# Altium schematic symbol library jlcpcb_2025_04_ferrites_extended_0603.schlib: 833 symbols (part 4 of 4)
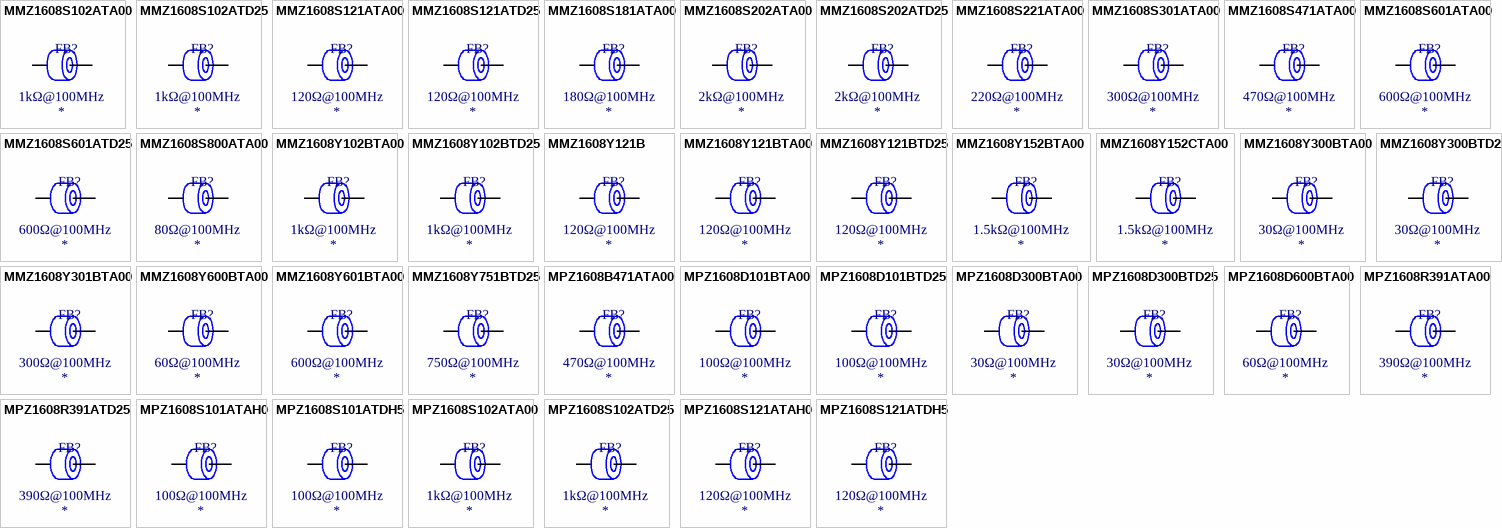
[diagram p23: symbols MMZ1608S102ATA00 to MPZ1608S121ATDH5]

## MPZ1608D101BTA00
designator FB?  Impedance @ Frequency: 100Ω@100MHz
Ferrite, 100Ω@100MHz, ±25%, 150mΩ, 1A, SMD 0603; Manufacturer: TDK; Manufacturer Part Number: MPZ1608D101BTA00; Package Size: 0603; JLCPCB Basic Part: No; JLCPCB Part Number: C87554; Supplier 1: LCSC; Category: Ferrite Beads; Supplier Part Number 1: C87554; Tolerance: ±25%; Rated Current: 1A; DC Resistance: 150mΩ; RoHS: Yes; ComponentLink1Description: Datasheet; ComponentLink1URL: https://wmsc.lcsc.com/wmsc/upload/file/pdf/v2/lcsc/2304140030_TDK-MPZ1608D101BTA00_C87554.pdf; ComponentLink2Description: JLCPCB Part URL; ComponentLink2URL: https://jlcpcb.com/partdetail/C87554; ComponentLink3Description: LCSC Part URL; ComponentLink3URL: https://lcsc.com/product-detail/Ferrite-Beads_TDK-TDK-MPZ1608D101BTA00_C87554.html
footprint FB-0603 (0603 (1608M) Ferrite)
pins: 1, 2

## MPZ1608D101BTD25
designator FB?  Impedance @ Frequency: 100Ω@100MHz
Ferrite, 100Ω@100MHz, ±25%, 150mΩ, 1A, SMD 0603; Manufacturer: TDK; Manufacturer Part Number: MPZ1608D101BTD25; Package Size: 0603; JLCPCB Basic Part: No; JLCPCB Part Number: C404684; Supplier 1: LCSC; Category: Ferrite Beads; Supplier Part Number 1: C404684; Tolerance: ±25%; Rated Current: 1A; DC Resistance: 150mΩ; RoHS: Yes; ComponentLink1Description: Datasheet; ComponentLink1URL: https://wmsc.lcsc.com/wmsc/upload/file/pdf/v2/lcsc/1912111437_TDK-MPZ1608D101BTD25_C404684.pdf; ComponentLink2Description: JLCPCB Part URL; ComponentLink2URL: https://jlcpcb.com/partdetail/C404684; ComponentLink3Description: LCSC Part URL; ComponentLink3URL: https://lcsc.com/product-detail/Ferrite-Beads_TDK-TDK-MPZ1608D101BTD25_C404684.html
footprint FB-0603 (0603 (1608M) Ferrite)
pins: 1, 2

## MPZ1608D300BTA00
designator FB?  Impedance @ Frequency: 30Ω@100MHz
Ferrite, 30Ω@100MHz, 60mΩ, 1.8A, SMD 0603; Manufacturer: TDK; Manufacturer Part Number: MPZ1608D300BTA00; Package Size: 0603; JLCPCB Basic Part: No; JLCPCB Part Number: C501997; Supplier 1: LCSC; Category: Ferrite Beads; Supplier Part Number 1: C501997; Rated Current: 1.8A; DC Resistance: 60mΩ; RoHS: Yes; ComponentLink1Description: Datasheet; ComponentLink1URL: https://wmsc.lcsc.com/wmsc/upload/file/pdf/v2/lcsc/2005151007_TDK-MPZ1608D300BTA00_C501997.pdf; ComponentLink2Description: JLCPCB Part URL; ComponentLink2URL: https://jlcpcb.com/partdetail/C501997; ComponentLink3Description: LCSC Part URL; ComponentLink3URL: https://lcsc.com/product-detail/Ferrite-Beads_TDK-TDK-MPZ1608D300BTA00_C501997.html
pins: 1, 2

## MPZ1608D300BTD25
designator FB?  Impedance @ Frequency: 30Ω@100MHz
Ferrite, 30Ω@100MHz, 60mΩ, 1.8A, SMD 0603; Manufacturer: TDK; Manufacturer Part Number: MPZ1608D300BTD25; Package Size: 0603; JLCPCB Basic Part: No; JLCPCB Part Number: C307767; Supplier 1: LCSC; Category: Ferrite Beads; Supplier Part Number 1: C307767; Rated Current: 1.8A; DC Resistance: 60mΩ; RoHS: Yes; ComponentLink1Description: Datasheet; ComponentLink1URL: https://wmsc.lcsc.com/wmsc/upload/file/pdf/v2/lcsc/2401161221_TDK-MPZ1608D300BTD25_C307767.pdf; ComponentLink2Description: JLCPCB Part URL; ComponentLink2URL: https://jlcpcb.com/partdetail/C307767; ComponentLink3Description: LCSC Part URL; ComponentLink3URL: https://lcsc.com/product-detail/Ferrite-Beads_TDK-TDK-MPZ1608D300BTD25_C307767.html
pins: 1, 2

## MPZ1608D600BTA00
designator FB?  Impedance @ Frequency: 60Ω@100MHz
Ferrite, 60Ω@100MHz, ±25%, 100mΩ, 1.2A, SMD 0603; Manufacturer: TDK; Manufacturer Part Number: MPZ1608D600BTA00; Package Size: 0603; JLCPCB Basic Part: No; JLCPCB Part Number: C275482; Supplier 1: LCSC; Category: Ferrite Beads; Supplier Part Number 1: C275482; Tolerance: ±25%; Rated Current: 1.2A; DC Resistance: 100mΩ; RoHS: Yes; ComponentLink1Description: Datasheet; ComponentLink1URL: https://wmsc.lcsc.com/wmsc/upload/file/pdf/v2/lcsc/2304140030_TDK-MPZ1608D600BTA00_C275482.pdf; ComponentLink2Description: JLCPCB Part URL; ComponentLink2URL: https://jlcpcb.com/partdetail/C275482; ComponentLink3Description: LCSC Part URL; ComponentLink3URL: https://lcsc.com/product-detail/Ferrite-Beads_TDK-TDK-MPZ1608D600BTA00_C275482.html
footprint FB-0603 (0603 (1608M) Ferrite)
pins: 1, 2

## MPZ1608R391ATA00
designator FB?  Impedance @ Frequency: 390Ω@100MHz
Ferrite, 390Ω@100MHz, ±25%, 120mΩ, 1.2A, SMD 0603; Manufacturer: TDK; Manufacturer Part Number: MPZ1608R391ATA00; Package Size: 0603; JLCPCB Basic Part: No; JLCPCB Part Number: C275483; Supplier 1: LCSC; Category: Ferrite Beads; Supplier Part Number 1: C275483; Tolerance: ±25%; Rated Current: 1.2A; DC Resistance: 120mΩ; RoHS: Yes; ComponentLink1Description: Datasheet; ComponentLink1URL: https://wmsc.lcsc.com/wmsc/upload/file/pdf/v2/lcsc/2304140030_TDK-MPZ1608R391ATA00_C275483.pdf; ComponentLink2Description: JLCPCB Part URL; ComponentLink2URL: https://jlcpcb.com/partdetail/C275483; ComponentLink3Description: LCSC Part URL; ComponentLink3URL: https://lcsc.com/product-detail/Ferrite-Beads_TDK-TDK-MPZ1608R391ATA00_C275483.html
footprint FB-0603 (0603 (1608M) Ferrite)
pins: 1, 2

## MPZ1608R391ATD25
designator FB?  Impedance @ Frequency: 390Ω@100MHz
Ferrite, 390Ω@100MHz, 120mΩ, 1.2A, SMD 0603; Manufacturer: TDK; Manufacturer Part Number: MPZ1608R391ATD25; Package Size: 0603; JLCPCB Basic Part: No; JLCPCB Part Number: C307768; Supplier 1: LCSC; Category: Ferrite Beads; Supplier Part Number 1: C307768; Rated Current: 1.2A; DC Resistance: 120mΩ; RoHS: Yes; ComponentLink1Description: Datasheet; ComponentLink1URL: https://wmsc.lcsc.com/wmsc/upload/file/pdf/v2/lcsc/2401161221_TDK-MPZ1608R391ATD25_C307768.pdf; ComponentLink2Description: JLCPCB Part URL; ComponentLink2URL: https://jlcpcb.com/partdetail/C307768; ComponentLink3Description: LCSC Part URL; ComponentLink3URL: https://lcsc.com/product-detail/Ferrite-Beads_TDK-TDK-MPZ1608R391ATD25_C307768.html
pins: 1, 2

## MPZ1608S101ATAH0
designator FB?  Impedance @ Frequency: 100Ω@100MHz
Ferrite, 100Ω@100MHz, ±25%, 30mΩ, 3A, SMD 0603; Manufacturer: TDK; Manufacturer Part Number: MPZ1608S101ATAH0; Package Size: 0603; JLCPCB Basic Part: No; JLCPCB Part Number: C107332; Supplier 1: LCSC; Category: Ferrite Beads; Supplier Part Number 1: C107332; Tolerance: ±25%; Rated Current: 3A; DC Resistance: 30mΩ; RoHS: Yes; ComponentLink1Description: Datasheet; ComponentLink1URL: https://wmsc.lcsc.com/wmsc/upload/file/pdf/v2/lcsc/2304140030_TDK-MPZ1608S101ATAH0_C107332.pdf; ComponentLink2Description: JLCPCB Part URL; ComponentLink2URL: https://jlcpcb.com/partdetail/C107332; ComponentLink3Description: LCSC Part URL; ComponentLink3URL: https://lcsc.com/product-detail/Ferrite-Beads_TDK-TDK-MPZ1608S101ATAH0_C107332.html
footprint FB-0603 (0603 (1608M) Ferrite)
pins: 1, 2

## MPZ1608S101ATDH5
designator FB?  Impedance @ Frequency: 100Ω@100MHz
Ferrite, 100Ω@100MHz, 30mΩ, 3A, SMD 0603; Manufacturer: TDK; Manufacturer Part Number: MPZ1608S101ATDH5; Package Size: 0603; JLCPCB Basic Part: No; JLCPCB Part Number: C307769; Supplier 1: LCSC; Category: Ferrite Beads; Supplier Part Number 1: C307769; Rated Current: 3A; DC Resistance: 30mΩ; RoHS: Yes; ComponentLink1Description: Datasheet; ComponentLink1URL: https://wmsc.lcsc.com/wmsc/upload/file/pdf/v2/lcsc/2401161221_TDK-MPZ1608S101ATDH5_C307769.pdf; ComponentLink2Description: JLCPCB Part URL; ComponentLink2URL: https://jlcpcb.com/partdetail/C307769; ComponentLink3Description: LCSC Part URL; ComponentLink3URL: https://lcsc.com/product-detail/Ferrite-Beads_TDK-TDK-MPZ1608S101ATDH5_C307769.html
pins: 1, 2

## MPZ1608S102ATA00
designator FB?  Impedance @ Frequency: 1kΩ@100MHz
Ferrite, 1kΩ@100MHz, ±25%, 300mΩ, 800mA, SMD 0603; Manufacturer: TDK; Manufacturer Part Number: MPZ1608S102ATA00; Package Size: 0603; JLCPCB Basic Part: No; JLCPCB Part Number: C76814; Supplier 1: LCSC; Category: Ferrite Beads; Supplier Part Number 1: C76814; Tolerance: ±25%; Rated Current: 800mA; DC Resistance: 300mΩ; RoHS: Yes; ComponentLink1Description: Datasheet; ComponentLink1URL: https://wmsc.lcsc.com/wmsc/upload/file/pdf/v2/lcsc/2304140030_TDK-MPZ1608S102ATA00_C76814.pdf; ComponentLink2Description: JLCPCB Part URL; ComponentLink2URL: https://jlcpcb.com/partdetail/C76814; ComponentLink3Description: LCSC Part URL; ComponentLink3URL: https://lcsc.com/product-detail/Ferrite-Beads_TDK-TDK-MPZ1608S102ATA00_C76814.html
footprint FB-0603 (0603 (1608M) Ferrite)
pins: 1, 2

## MPZ1608S102ATD25
designator FB?  Impedance @ Frequency: 1kΩ@100MHz
Ferrite, 1kΩ@100MHz, ±25%, 300mΩ, 800mA, SMD 0603; Manufacturer: TDK; Manufacturer Part Number: MPZ1608S102ATD25; Package Size: 0603; JLCPCB Basic Part: No; JLCPCB Part Number: C193411; Supplier 1: LCSC; Category: Ferrite Beads; Supplier Part Number 1: C193411; Tolerance: ±25%; Rated Current: 800mA; DC Resistance: 300mΩ; RoHS: Yes; ComponentLink1Description: Datasheet; ComponentLink1URL: https://wmsc.lcsc.com/wmsc/upload/file/pdf/v2/lcsc/2304140030_TDK-MPZ1608S102ATD25_C193411.pdf; ComponentLink2Description: JLCPCB Part URL; ComponentLink2URL: https://jlcpcb.com/partdetail/C193411; ComponentLink3Description: LCSC Part URL; ComponentLink3URL: https://lcsc.com/product-detail/Ferrite-Beads_TDK-TDK-MPZ1608S102ATD25_C193411.html
footprint FB-0603 (0603 (1608M) Ferrite)
pins: 1, 2

## MPZ1608S121ATAH0
designator FB?  Impedance @ Frequency: 120Ω@100MHz
Ferrite, 120Ω@100MHz, ±25%, 45mΩ, 2A, SMD 0603; Manufacturer: TDK; Manufacturer Part Number: MPZ1608S121ATAH0; Package Size: 0603; JLCPCB Basic Part: No; JLCPCB Part Number: C114770; Supplier 1: LCSC; Category: Ferrite Beads; Supplier Part Number 1: C114770; Tolerance: ±25%; Rated Current: 2A; DC Resistance: 45mΩ; RoHS: Yes; ComponentLink1Description: Datasheet; ComponentLink1URL: https://wmsc.lcsc.com/wmsc/upload/file/pdf/v2/lcsc/2304140030_TDK-MPZ1608S121ATAH0_C114770.pdf; ComponentLink2Description: JLCPCB Part URL; ComponentLink2URL: https://jlcpcb.com/partdetail/C114770; ComponentLink3Description: LCSC Part URL; ComponentLink3URL: https://lcsc.com/product-detail/Ferrite-Beads_TDK-TDK-MPZ1608S121ATAH0_C114770.html
footprint FB-0603 (0603 (1608M) Ferrite)
pins: 1, 2

## MPZ1608S121ATDH5
designator FB?  Impedance @ Frequency: 120Ω@100MHz
Ferrite, 120Ω@100MHz, 45mΩ, 2A, SMD 0603; Manufacturer: TDK; Manufacturer Part Number: MPZ1608S121ATDH5; Package Size: 0603; JLCPCB Basic Part: No; JLCPCB Part Number: C307770; Supplier 1: LCSC; Category: Ferrite Beads; Supplier Part Number 1: C307770; Rated Current: 2A; DC Resistance: 45mΩ; RoHS: Yes; ComponentLink1Description: Datasheet; ComponentLink1URL: https://wmsc.lcsc.com/wmsc/upload/file/pdf/v2/lcsc/2401161221_TDK-MPZ1608S121ATDH5_C307770.pdf; ComponentLink2Description: JLCPCB Part URL; ComponentLink2URL: https://jlcpcb.com/partdetail/C307770; ComponentLink3Description: LCSC Part URL; ComponentLink3URL: https://lcsc.com/product-detail/Ferrite-Beads_TDK-TDK-MPZ1608S121ATDH5_C307770.html
pins: 1, 2

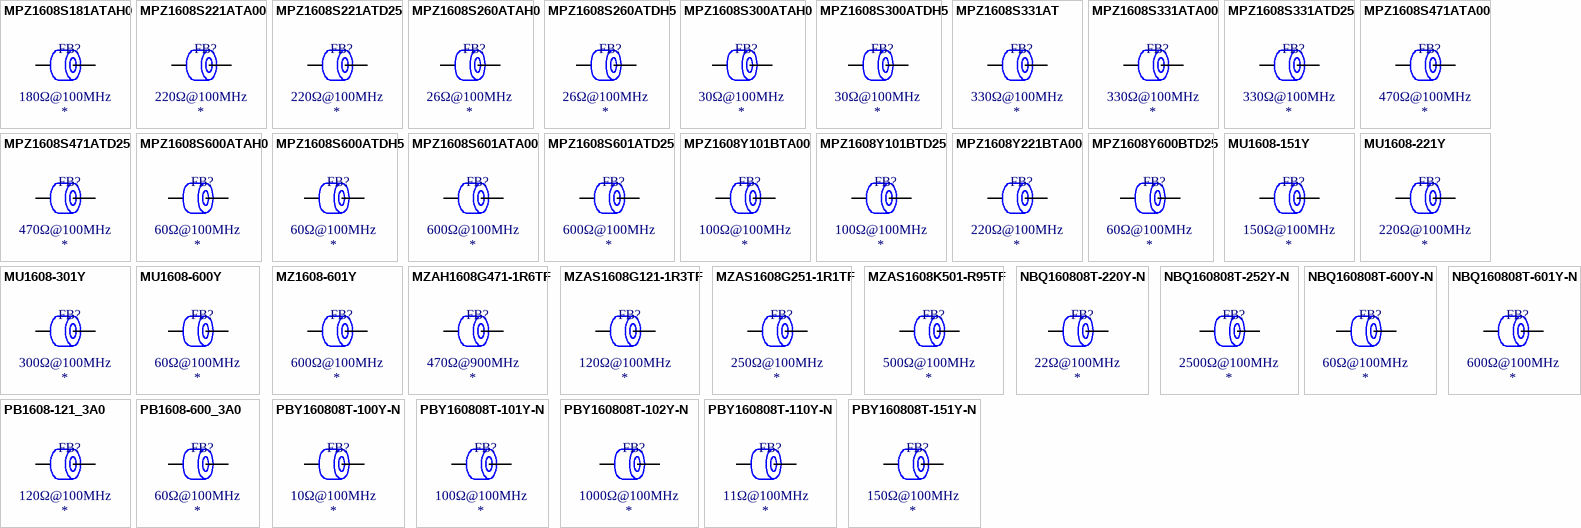
[diagram p16: symbols MPZ1608S181ATAH0 to PBY160808T-151Y-N]

## MPZ1608S181ATAH0
designator FB?  Impedance @ Frequency: 180Ω@100MHz
Ferrite, 180Ω@100MHz, ±25%, 50mΩ, 2A, SMD 0603; Manufacturer: TDK; Manufacturer Part Number: MPZ1608S181ATAH0; Package Size: 0603; JLCPCB Basic Part: No; JLCPCB Part Number: C275484; Supplier 1: LCSC; Category: Ferrite Beads; Supplier Part Number 1: C275484; Tolerance: ±25%; Rated Current: 2A; DC Resistance: 50mΩ; RoHS: Yes; ComponentLink1Description: Datasheet; ComponentLink1URL: https://wmsc.lcsc.com/wmsc/upload/file/pdf/v2/lcsc/2304140030_TDK-MPZ1608S181ATAH0_C275484.pdf; ComponentLink2Description: JLCPCB Part URL; ComponentLink2URL: https://jlcpcb.com/partdetail/C275484; ComponentLink3Description: LCSC Part URL; ComponentLink3URL: https://lcsc.com/product-detail/Ferrite-Beads_TDK-TDK-MPZ1608S181ATAH0_C275484.html
footprint FB-0603 (0603 (1608M) Ferrite)
pins: 1, 2

## MPZ1608S221ATA00
designator FB?  Impedance @ Frequency: 220Ω@100MHz
Ferrite, 220Ω@100MHz, ±25%, 50mΩ, 2.2A, SMD 0603; Manufacturer: TDK; Manufacturer Part Number: MPZ1608S221ATA00; Package Size: 0603; JLCPCB Basic Part: No; JLCPCB Part Number: C76815; Supplier 1: LCSC; Category: Ferrite Beads; Supplier Part Number 1: C76815; Tolerance: ±25%; Rated Current: 2.2A; DC Resistance: 50mΩ; RoHS: Yes; ComponentLink1Description: Datasheet; ComponentLink1URL: https://wmsc.lcsc.com/wmsc/upload/file/pdf/v2/lcsc/1811131630_TDK-MPZ1608S221ATA00_C76815.pdf; ComponentLink2Description: JLCPCB Part URL; ComponentLink2URL: https://jlcpcb.com/partdetail/C76815; ComponentLink3Description: LCSC Part URL; ComponentLink3URL: https://lcsc.com/product-detail/Ferrite-Beads_TDK-TDK-MPZ1608S221ATA00_C76815.html
footprint FB-0603 (0603 (1608M) Ferrite)
pins: 1, 2

## MPZ1608S221ATD25
designator FB?  Impedance @ Frequency: 220Ω@100MHz
Ferrite, 220Ω@100MHz, 50mΩ, 2.2A, SMD 0603; Manufacturer: TDK; Manufacturer Part Number: MPZ1608S221ATD25; Package Size: 0603; JLCPCB Basic Part: No; JLCPCB Part Number: C307771; Supplier 1: LCSC; Category: Ferrite Beads; Supplier Part Number 1: C307771; Rated Current: 2.2A; DC Resistance: 50mΩ; RoHS: Yes; ComponentLink1Description: Datasheet; ComponentLink1URL: https://wmsc.lcsc.com/wmsc/upload/file/pdf/v2/lcsc/2111251830_TDK-MPZ1608S221ATD25_C307771.pdf; ComponentLink2Description: JLCPCB Part URL; ComponentLink2URL: https://jlcpcb.com/partdetail/C307771; ComponentLink3Description: LCSC Part URL; ComponentLink3URL: https://lcsc.com/product-detail/Ferrite-Beads_TDK-TDK-MPZ1608S221ATD25_C307771.html
pins: 1, 2

## MPZ1608S260ATAH0
designator FB?  Impedance @ Frequency: 26Ω@100MHz
Ferrite, 26Ω@100MHz, ±25%, 7mΩ, 6A, SMD 0603; Manufacturer: TDK; Manufacturer Part Number: MPZ1608S260ATAH0; Package Size: 0603; JLCPCB Basic Part: No; JLCPCB Part Number: C275485; Supplier 1: LCSC; Category: Ferrite Beads; Supplier Part Number 1: C275485; Tolerance: ±25%; Rated Current: 6A; DC Resistance: 7mΩ; RoHS: Yes; ComponentLink1Description: Datasheet; ComponentLink1URL: https://wmsc.lcsc.com/wmsc/upload/file/pdf/v2/lcsc/2304140030_TDK-MPZ1608S260ATAH0_C275485.pdf; ComponentLink2Description: JLCPCB Part URL; ComponentLink2URL: https://jlcpcb.com/partdetail/C275485; ComponentLink3Description: LCSC Part URL; ComponentLink3URL: https://lcsc.com/product-detail/Ferrite-Beads_TDK-TDK-MPZ1608S260ATAH0_C275485.html
footprint FB-0603 (0603 (1608M) Ferrite)
pins: 1, 2

## MPZ1608S260ATDH5
designator FB?  Impedance @ Frequency: 26Ω@100MHz
Ferrite, 26Ω@100MHz, ±25%, 7mΩ, 6A, SMD 0603; Manufacturer: TDK; Manufacturer Part Number: MPZ1608S260ATDH5; Package Size: 0603; JLCPCB Basic Part: No; JLCPCB Part Number: C404673; Supplier 1: LCSC; Category: Ferrite Beads; Supplier Part Number 1: C404673; Tolerance: ±25%; Rated Current: 6A; DC Resistance: 7mΩ; RoHS: Yes; ComponentLink1Description: Datasheet; ComponentLink1URL: https://wmsc.lcsc.com/wmsc/upload/file/pdf/v2/lcsc/2304140030_TDK-MPZ1608S260ATDH5_C404673.pdf; ComponentLink2Description: JLCPCB Part URL; ComponentLink2URL: https://jlcpcb.com/partdetail/C404673; ComponentLink3Description: LCSC Part URL; ComponentLink3URL: https://lcsc.com/product-detail/Ferrite-Beads_TDK-TDK-MPZ1608S260ATDH5_C404673.html
footprint FB-0603 (0603 (1608M) Ferrite)
pins: 1, 2

## MPZ1608S300ATAH0
designator FB?  Impedance @ Frequency: 30Ω@100MHz
Ferrite, 30Ω@100MHz, 10mΩ, 5A, SMD 0603; Manufacturer: TDK; Manufacturer Part Number: MPZ1608S300ATAH0; Package Size: 0603; JLCPCB Basic Part: No; JLCPCB Part Number: C275486; Supplier 1: LCSC; Category: Ferrite Beads; Supplier Part Number 1: C275486; Rated Current: 5A; DC Resistance: 10mΩ; RoHS: Yes; ComponentLink1Description: Datasheet; ComponentLink1URL: https://wmsc.lcsc.com/wmsc/upload/file/pdf/v2/lcsc/2304140030_TDK-MPZ1608S300ATAH0_C275486.pdf; ComponentLink2Description: JLCPCB Part URL; ComponentLink2URL: https://jlcpcb.com/partdetail/C275486; ComponentLink3Description: LCSC Part URL; ComponentLink3URL: https://lcsc.com/product-detail/Ferrite-Beads_TDK-TDK-MPZ1608S300ATAH0_C275486.html
pins: 1, 2

## MPZ1608S300ATDH5
designator FB?  Impedance @ Frequency: 30Ω@100MHz
Ferrite, 30Ω@100MHz, 10mΩ, 5A, SMD 0603; Manufacturer: TDK; Manufacturer Part Number: MPZ1608S300ATDH5; Package Size: 0603; JLCPCB Basic Part: No; JLCPCB Part Number: C307772; Supplier 1: LCSC; Category: Ferrite Beads; Supplier Part Number 1: C307772; Rated Current: 5A; DC Resistance: 10mΩ; RoHS: Yes; ComponentLink1Description: Datasheet; ComponentLink1URL: https://wmsc.lcsc.com/wmsc/upload/file/pdf/v2/lcsc/2401161221_TDK-MPZ1608S300ATDH5_C307772.pdf; ComponentLink2Description: JLCPCB Part URL; ComponentLink2URL: https://jlcpcb.com/partdetail/C307772; ComponentLink3Description: LCSC Part URL; ComponentLink3URL: https://lcsc.com/product-detail/Ferrite-Beads_TDK-TDK-MPZ1608S300ATDH5_C307772.html
pins: 1, 2

## MPZ1608S331AT
designator FB?  Impedance @ Frequency: 330Ω@100MHz
Ferrite, 330Ω@100MHz, ±25%, 80mΩ, 1.7A, SMD 0603; Manufacturer: TDK; Manufacturer Part Number: MPZ1608S331AT; Package Size: 0603; JLCPCB Basic Part: No; JLCPCB Part Number: C107334; Supplier 1: LCSC; Category: Ferrite Beads; Supplier Part Number 1: C107334; Tolerance: ±25%; Rated Current: 1.7A; DC Resistance: 80mΩ; RoHS: Yes; ComponentLink1Description: Datasheet; ComponentLink1URL: https://wmsc.lcsc.com/wmsc/upload/file/pdf/v2/lcsc/2304140030_TDK-MPZ1608S331AT_C107334.pdf; ComponentLink2Description: JLCPCB Part URL; ComponentLink2URL: https://jlcpcb.com/partdetail/C107334; ComponentLink3Description: LCSC Part URL; ComponentLink3URL: https://lcsc.com/product-detail/Ferrite-Beads_TDK-TDK-MPZ1608S331AT_C107334.html
footprint FB-0603 (0603 (1608M) Ferrite)
pins: 1, 2

## MPZ1608S331ATA00
designator FB?  Impedance @ Frequency: 330Ω@100MHz
Ferrite, 330Ω@100MHz, ±25%, 80mΩ, 1.7A, SMD 0603; Manufacturer: TDK; Manufacturer Part Number: MPZ1608S331ATA00; Package Size: 0603; JLCPCB Basic Part: No; JLCPCB Part Number: C275487; Supplier 1: LCSC; Category: Ferrite Beads; Supplier Part Number 1: C275487; Tolerance: ±25%; Rated Current: 1.7A; DC Resistance: 80mΩ; RoHS: Yes; ComponentLink1Description: Datasheet; ComponentLink1URL: https://wmsc.lcsc.com/wmsc/upload/file/pdf/v2/lcsc/2304140030_TDK-MPZ1608S331ATA00_C275487.pdf; ComponentLink2Description: JLCPCB Part URL; ComponentLink2URL: https://jlcpcb.com/partdetail/C275487; ComponentLink3Description: LCSC Part URL; ComponentLink3URL: https://lcsc.com/product-detail/Ferrite-Beads_TDK-TDK-MPZ1608S331ATA00_C275487.html
footprint FB-0603 (0603 (1608M) Ferrite)
pins: 1, 2

## MPZ1608S331ATD25
designator FB?  Impedance @ Frequency: 330Ω@100MHz
Ferrite, 330Ω@100MHz, ±25%, 80mΩ, 1.7A, SMD 0603; Manufacturer: TDK; Manufacturer Part Number: MPZ1608S331ATD25; Package Size: 0603; JLCPCB Basic Part: No; JLCPCB Part Number: C307773; Supplier 1: LCSC; Category: Ferrite Beads; Supplier Part Number 1: C307773; Tolerance: ±25%; Rated Current: 1.7A; DC Resistance: 80mΩ; RoHS: Yes; ComponentLink1Description: Datasheet; ComponentLink1URL: https://wmsc.lcsc.com/wmsc/upload/file/pdf/v2/lcsc/2304140030_TDK-MPZ1608S331ATD25_C307773.pdf; ComponentLink2Description: JLCPCB Part URL; ComponentLink2URL: https://jlcpcb.com/partdetail/C307773; ComponentLink3Description: LCSC Part URL; ComponentLink3URL: https://lcsc.com/product-detail/Ferrite-Beads_TDK-TDK-MPZ1608S331ATD25_C307773.html
footprint FB-0603 (0603 (1608M) Ferrite)
pins: 1, 2

## MPZ1608S471ATA00
designator FB?  Impedance @ Frequency: 470Ω@100MHz
Ferrite, 470Ω@100MHz, ±25%, 150mΩ, 1A, SMD 0603; Manufacturer: TDK; Manufacturer Part Number: MPZ1608S471ATA00; Package Size: 0603; JLCPCB Basic Part: No; JLCPCB Part Number: C87555; Supplier 1: LCSC; Category: Ferrite Beads; Supplier Part Number 1: C87555; Tolerance: ±25%; Rated Current: 1A; DC Resistance: 150mΩ; RoHS: Yes; ComponentLink1Description: Datasheet; ComponentLink1URL: https://wmsc.lcsc.com/wmsc/upload/file/pdf/v2/lcsc/2304140030_TDK-MPZ1608S471ATA00_C87555.pdf; ComponentLink2Description: JLCPCB Part URL; ComponentLink2URL: https://jlcpcb.com/partdetail/C87555; ComponentLink3Description: LCSC Part URL; ComponentLink3URL: https://lcsc.com/product-detail/Ferrite-Beads_TDK-TDK-MPZ1608S471ATA00_C87555.html
footprint FB-0603 (0603 (1608M) Ferrite)
pins: 1, 2

## MPZ1608S471ATD25
designator FB?  Impedance @ Frequency: 470Ω@100MHz
Ferrite, 470Ω@100MHz, 150mΩ, 1A, SMD 0603; Manufacturer: TDK; Manufacturer Part Number: MPZ1608S471ATD25; Package Size: 0603; JLCPCB Basic Part: No; JLCPCB Part Number: C307774; Supplier 1: LCSC; Category: Ferrite Beads; Supplier Part Number 1: C307774; Rated Current: 1A; DC Resistance: 150mΩ; RoHS: Yes; ComponentLink1Description: Datasheet; ComponentLink1URL: https://wmsc.lcsc.com/wmsc/upload/file/pdf/v2/lcsc/2401161221_TDK-MPZ1608S471ATD25_C307774.pdf; ComponentLink2Description: JLCPCB Part URL; ComponentLink2URL: https://jlcpcb.com/partdetail/C307774; ComponentLink3Description: LCSC Part URL; ComponentLink3URL: https://lcsc.com/product-detail/Ferrite-Beads_TDK-TDK-MPZ1608S471ATD25_C307774.html
pins: 1, 2

## MPZ1608S600ATAH0
designator FB?  Impedance @ Frequency: 60Ω@100MHz
Ferrite, 60Ω@100MHz, ±25%, 20mΩ, 3.5A, SMD 0603; Manufacturer: TDK; Manufacturer Part Number: MPZ1608S600ATAH0; Package Size: 0603; JLCPCB Basic Part: No; JLCPCB Part Number: C76816; Supplier 1: LCSC; Category: Ferrite Beads; Supplier Part Number 1: C76816; Tolerance: ±25%; Rated Current: 3.5A; DC Resistance: 20mΩ; RoHS: Yes; ComponentLink1Description: Datasheet; ComponentLink1URL: https://wmsc.lcsc.com/wmsc/upload/file/pdf/v2/lcsc/2304140030_TDK-MPZ1608S600ATAH0_C76816.pdf; ComponentLink2Description: JLCPCB Part URL; ComponentLink2URL: https://jlcpcb.com/partdetail/C76816; ComponentLink3Description: LCSC Part URL; ComponentLink3URL: https://lcsc.com/product-detail/Ferrite-Beads_TDK-TDK-MPZ1608S600ATAH0_C76816.html
footprint FB-0603 (0603 (1608M) Ferrite)
pins: 1, 2

## MPZ1608S600ATDH5
designator FB?  Impedance @ Frequency: 60Ω@100MHz
Ferrite, 60Ω@100MHz, ±25%, 20mΩ, 3.5A, SMD 0603; Manufacturer: TDK; Manufacturer Part Number: MPZ1608S600ATDH5; Package Size: 0603; JLCPCB Basic Part: No; JLCPCB Part Number: C307775; Supplier 1: LCSC; Category: Ferrite Beads; Supplier Part Number 1: C307775; Tolerance: ±25%; Rated Current: 3.5A; DC Resistance: 20mΩ; RoHS: Yes; ComponentLink1Description: Datasheet; ComponentLink1URL: https://wmsc.lcsc.com/wmsc/upload/file/pdf/v2/lcsc/1912111437_TDK-MPZ1608S600ATDH5_C307775.pdf; ComponentLink2Description: JLCPCB Part URL; ComponentLink2URL: https://jlcpcb.com/partdetail/C307775; ComponentLink3Description: LCSC Part URL; ComponentLink3URL: https://lcsc.com/product-detail/Ferrite-Beads_TDK-TDK-MPZ1608S600ATDH5_C307775.html
footprint FB-0603 (0603 (1608M) Ferrite)
pins: 1, 2

## MPZ1608S601ATA00
designator FB?  Impedance @ Frequency: 600Ω@100MHz
Ferrite, 600Ω@100MHz, ±25%, 150mΩ, 1A, SMD 0603; Manufacturer: TDK; Manufacturer Part Number: MPZ1608S601ATA00; Package Size: 0603; JLCPCB Basic Part: No; JLCPCB Part Number: C107335; Supplier 1: LCSC; Category: Ferrite Beads; Supplier Part Number 1: C107335; Tolerance: ±25%; Rated Current: 1A; DC Resistance: 150mΩ; RoHS: Yes; ComponentLink1Description: Datasheet; ComponentLink1URL: https://wmsc.lcsc.com/wmsc/upload/file/pdf/v2/lcsc/1811131654_TDK-MPZ1608S601ATA00_C107335.pdf; ComponentLink2Description: JLCPCB Part URL; ComponentLink2URL: https://jlcpcb.com/partdetail/C107335; ComponentLink3Description: LCSC Part URL; ComponentLink3URL: https://lcsc.com/product-detail/Ferrite-Beads_TDK-TDK-MPZ1608S601ATA00_C107335.html
footprint FB-0603 (0603 (1608M) Ferrite)
pins: 1, 2

## MPZ1608S601ATD25
designator FB?  Impedance @ Frequency: 600Ω@100MHz
Ferrite, 600Ω@100MHz, ±25%, 150mΩ, 1A, SMD 0603; Manufacturer: TDK; Manufacturer Part Number: MPZ1608S601ATD25; Package Size: 0603; JLCPCB Basic Part: No; JLCPCB Part Number: C193536; Supplier 1: LCSC; Category: Ferrite Beads; Supplier Part Number 1: C193536; Tolerance: ±25%; Rated Current: 1A; DC Resistance: 150mΩ; RoHS: Yes; ComponentLink1Description: Datasheet; ComponentLink1URL: https://wmsc.lcsc.com/wmsc/upload/file/pdf/v2/lcsc/2304140030_TDK-MPZ1608S601ATD25_C193536.pdf; ComponentLink2Description: JLCPCB Part URL; ComponentLink2URL: https://jlcpcb.com/partdetail/C193536; ComponentLink3Description: LCSC Part URL; ComponentLink3URL: https://lcsc.com/product-detail/Ferrite-Beads_TDK-TDK-MPZ1608S601ATD25_C193536.html
footprint FB-0603 (0603 (1608M) Ferrite)
pins: 1, 2

## MPZ1608Y101BTA00
designator FB?  Impedance @ Frequency: 100Ω@100MHz
Ferrite, 100Ω@100MHz, ±25%, 40mΩ, 2A, SMD 0603; Manufacturer: TDK; Manufacturer Part Number: MPZ1608Y101BTA00; Package Size: 0603; JLCPCB Basic Part: No; JLCPCB Part Number: C501996; Supplier 1: LCSC; Category: Ferrite Beads; Supplier Part Number 1: C501996; Tolerance: ±25%; Rated Current: 2A; DC Resistance: 40mΩ; RoHS: Yes; ComponentLink1Description: Datasheet; ComponentLink1URL: https://wmsc.lcsc.com/wmsc/upload/file/pdf/v2/lcsc/2304140030_TDK-MPZ1608Y101BTA00_C501996.pdf; ComponentLink2Description: JLCPCB Part URL; ComponentLink2URL: https://jlcpcb.com/partdetail/C501996; ComponentLink3Description: LCSC Part URL; ComponentLink3URL: https://lcsc.com/product-detail/Ferrite-Beads_TDK-TDK-MPZ1608Y101BTA00_C501996.html
footprint FB-0603 (0603 (1608M) Ferrite)
pins: 1, 2

## MPZ1608Y101BTD25
designator FB?  Impedance @ Frequency: 100Ω@100MHz
Ferrite, 100Ω@100MHz, ±25%, 40mΩ, 2A, SMD 0603; Manufacturer: TDK; Manufacturer Part Number: MPZ1608Y101BTD25; Package Size: 0603; JLCPCB Basic Part: No; JLCPCB Part Number: C404680; Supplier 1: LCSC; Category: Ferrite Beads; Supplier Part Number 1: C404680; Tolerance: ±25%; Rated Current: 2A; DC Resistance: 40mΩ; RoHS: Yes; ComponentLink1Description: Datasheet; ComponentLink1URL: https://wmsc.lcsc.com/wmsc/upload/file/pdf/v2/lcsc/2304140030_TDK-MPZ1608Y101BTD25_C404680.pdf; ComponentLink2Description: JLCPCB Part URL; ComponentLink2URL: https://jlcpcb.com/partdetail/C404680; ComponentLink3Description: LCSC Part URL; ComponentLink3URL: https://lcsc.com/product-detail/Ferrite-Beads_TDK-TDK-MPZ1608Y101BTD25_C404680.html
footprint FB-0603 (0603 (1608M) Ferrite)
pins: 1, 2

## MPZ1608Y221BTA00
designator FB?  Impedance @ Frequency: 220Ω@100MHz
Ferrite, 220Ω@100MHz, ±25%, 100mΩ, 1.5A, SMD 0603; Manufacturer: TDK; Manufacturer Part Number: MPZ1608Y221BTA00; Package Size: 0603; JLCPCB Basic Part: No; JLCPCB Part Number: C275489; Supplier 1: LCSC; Category: Ferrite Beads; Supplier Part Number 1: C275489; Tolerance: ±25%; Rated Current: 1.5A; DC Resistance: 100mΩ; RoHS: Yes; ComponentLink1Description: Datasheet; ComponentLink1URL: https://wmsc.lcsc.com/wmsc/upload/file/pdf/v2/lcsc/1811131653_TDK-MPZ1608Y221BTA00_C275489.pdf; ComponentLink2Description: JLCPCB Part URL; ComponentLink2URL: https://jlcpcb.com/partdetail/C275489; ComponentLink3Description: LCSC Part URL; ComponentLink3URL: https://lcsc.com/product-detail/Ferrite-Beads_TDK-TDK-MPZ1608Y221BTA00_C275489.html
footprint FB-0603 (0603 (1608M) Ferrite)
pins: 1, 2

## MPZ1608Y600BTD25
designator FB?  Impedance @ Frequency: 60Ω@100MHz
Ferrite, 60Ω@100MHz, ±25%, 30mΩ, 2.3A, SMD 0603; Manufacturer: TDK; Manufacturer Part Number: MPZ1608Y600BTD25; Package Size: 0603; JLCPCB Basic Part: No; JLCPCB Part Number: C404679; Supplier 1: LCSC; Category: Ferrite Beads; Supplier Part Number 1: C404679; Tolerance: ±25%; Rated Current: 2.3A; DC Resistance: 30mΩ; RoHS: Yes; ComponentLink1Description: Datasheet; ComponentLink1URL: https://wmsc.lcsc.com/wmsc/upload/file/pdf/v2/lcsc/2304140030_TDK-MPZ1608Y600BTD25_C404679.pdf; ComponentLink2Description: JLCPCB Part URL; ComponentLink2URL: https://jlcpcb.com/partdetail/C404679; ComponentLink3Description: LCSC Part URL; ComponentLink3URL: https://lcsc.com/product-detail/Ferrite-Beads_TDK-TDK-MPZ1608Y600BTD25_C404679.html
footprint FB-0603 (0603 (1608M) Ferrite)
pins: 1, 2

## MU1608-151Y
designator FB?  Impedance @ Frequency: 150Ω@100MHz
Ferrite, 150Ω@100MHz, ±25%, 0.25Ω, 600mA, SMD 0603; Manufacturer: BOURNS; Manufacturer Part Number: MU1608-151Y; Package Size: 0603; JLCPCB Basic Part: No; JLCPCB Part Number: C139470; Supplier 1: LCSC; Category: Ferrite Beads; Supplier Part Number 1: C139470; Tolerance: ±25%; Rated Current: 600mA; DC Resistance: 0.25Ω; RoHS: Yes; ComponentLink1Description: Datasheet; ComponentLink1URL: https://wmsc.lcsc.com/wmsc/upload/file/pdf/v2/lcsc/2304140030_BOURNS-MU1608-151Y_C139470.pdf; ComponentLink2Description: JLCPCB Part URL; ComponentLink2URL: https://jlcpcb.com/partdetail/C139470; ComponentLink3Description: LCSC Part URL; ComponentLink3URL: https://lcsc.com/product-detail/Ferrite-Beads_BOURNS-BOURNS-MU1608-151Y_C139470.html
footprint FB-0603 (0603 (1608M) Ferrite)
pins: 1, 2

## MU1608-221Y
designator FB?  Impedance @ Frequency: 220Ω@100MHz
Ferrite, 220Ω@100MHz, ±25%, 0.3Ω, 200mA, SMD 0603; Manufacturer: BOURNS; Manufacturer Part Number: MU1608-221Y; Package Size: 0603; JLCPCB Basic Part: No; JLCPCB Part Number: C139471; Supplier 1: LCSC; Category: Ferrite Beads; Supplier Part Number 1: C139471; Tolerance: ±25%; Rated Current: 200mA; DC Resistance: 0.3Ω; RoHS: Yes; ComponentLink1Description: Datasheet; ComponentLink1URL: https://wmsc.lcsc.com/wmsc/upload/file/pdf/v2/lcsc/2304140030_BOURNS-MU1608-221Y_C139471.pdf; ComponentLink2Description: JLCPCB Part URL; ComponentLink2URL: https://jlcpcb.com/partdetail/C139471; ComponentLink3Description: LCSC Part URL; ComponentLink3URL: https://lcsc.com/product-detail/Ferrite-Beads_BOURNS-BOURNS-MU1608-221Y_C139471.html
footprint FB-0603 (0603 (1608M) Ferrite)
pins: 1, 2

## MU1608-301Y
designator FB?  Impedance @ Frequency: 300Ω@100MHz
Ferrite, 300Ω@100MHz, ±25%, 0.35Ω, 150mA, SMD 0603; Manufacturer: BOURNS; Manufacturer Part Number: MU1608-301Y; Package Size: 0603; JLCPCB Basic Part: No; JLCPCB Part Number: C139472; Supplier 1: LCSC; Category: Ferrite Beads; Supplier Part Number 1: C139472; Tolerance: ±25%; Rated Current: 150mA; DC Resistance: 0.35Ω; RoHS: Yes; ComponentLink1Description: Datasheet; ComponentLink1URL: https://wmsc.lcsc.com/wmsc/upload/file/pdf/v2/lcsc/2304140030_BOURNS-MU1608-301Y_C139472.pdf; ComponentLink2Description: JLCPCB Part URL; ComponentLink2URL: https://jlcpcb.com/partdetail/C139472; ComponentLink3Description: LCSC Part URL; ComponentLink3URL: https://lcsc.com/product-detail/Ferrite-Beads_BOURNS-BOURNS-MU1608-301Y_C139472.html
footprint FB-0603 (0603 (1608M) Ferrite)
pins: 1, 2

## MU1608-600Y
designator FB?  Impedance @ Frequency: 60Ω@100MHz
Ferrite, 60Ω@100MHz, ±25%, 0.2Ω, 700mA, SMD 0603; Manufacturer: BOURNS; Manufacturer Part Number: MU1608-600Y; Package Size: 0603; JLCPCB Basic Part: No; JLCPCB Part Number: C139473; Supplier 1: LCSC; Category: Ferrite Beads; Supplier Part Number 1: C139473; Tolerance: ±25%; Rated Current: 700mA; DC Resistance: 0.2Ω; RoHS: Yes; ComponentLink1Description: Datasheet; ComponentLink1URL: https://wmsc.lcsc.com/wmsc/upload/file/pdf/v2/lcsc/2304140030_BOURNS-MU1608-600Y_C139473.pdf; ComponentLink2Description: JLCPCB Part URL; ComponentLink2URL: https://jlcpcb.com/partdetail/C139473; ComponentLink3Description: LCSC Part URL; ComponentLink3URL: https://lcsc.com/product-detail/Ferrite-Beads_BOURNS-BOURNS-MU1608-600Y_C139473.html
footprint FB-0603 (0603 (1608M) Ferrite)
pins: 1, 2

## MZ1608-601Y
designator FB?  Impedance @ Frequency: 600Ω@100MHz
Ferrite, 600Ω@100MHz, ±25%, 0.45Ω, 100mA, SMD 0603; Manufacturer: BOURNS; Manufacturer Part Number: MZ1608-601Y; Package Size: 0603; JLCPCB Basic Part: No; JLCPCB Part Number: C139476; Supplier 1: LCSC; Category: Ferrite Beads; Supplier Part Number 1: C139476; Tolerance: ±25%; Rated Current: 100mA; DC Resistance: 0.45Ω; RoHS: Yes; ComponentLink1Description: Datasheet; ComponentLink1URL: https://wmsc.lcsc.com/wmsc/upload/file/pdf/v2/lcsc/1809052114_BOURNS-MZ1608-601Y_C139476.pdf; ComponentLink2Description: JLCPCB Part URL; ComponentLink2URL: https://jlcpcb.com/partdetail/C139476; ComponentLink3Description: LCSC Part URL; ComponentLink3URL: https://lcsc.com/product-detail/Ferrite-Beads_BOURNS-BOURNS-MZ1608-601Y_C139476.html
footprint FB-0603 (0603 (1608M) Ferrite)
pins: 1, 2

## MZAH1608G471-1R6TF
designator FB?  Impedance @ Frequency: 470Ω@900MHz
Ferrite, 470Ω@900MHz, ±25%, 75mΩ, 1.6A, SMD 0603; Manufacturer: Sunlord; Manufacturer Part Number: MZAH1608G471-1R6TF; Package Size: 0603; JLCPCB Basic Part: No; JLCPCB Part Number: C709652; Supplier 1: LCSC; Category: Ferrite Beads; Supplier Part Number 1: C709652; Tolerance: ±25%; Rated Current: 1.6A; DC Resistance: 75mΩ; RoHS: Yes; ComponentLink1Description: Datasheet; ComponentLink1URL: https://wmsc.lcsc.com/wmsc/upload/file/pdf/v2/lcsc/2310301640_Sunlord-MZAH1608G471-1R6TF_C709652.pdf; ComponentLink2Description: JLCPCB Part URL; ComponentLink2URL: https://jlcpcb.com/partdetail/C709652; ComponentLink3Description: LCSC Part URL; ComponentLink3URL: https://lcsc.com/product-detail/Ferrite-Beads_Sunlord-Sunlord-MZAH1608G471-1R6TF_C709652.html
footprint FB-0603 (0603 (1608M) Ferrite)
pins: 1, 2

## MZAS1608G121-1R3TF
designator FB?  Impedance @ Frequency: 120Ω@100MHz
Ferrite, 120Ω@100MHz, ±25%, 140mΩ, 1.3A, SMD 0603; Manufacturer: Sunlord; Manufacturer Part Number: MZAS1608G121-1R3TF; Package Size: 0603; JLCPCB Basic Part: No; JLCPCB Part Number: C709642; Supplier 1: LCSC; Category: Ferrite Beads; Supplier Part Number 1: C709642; Tolerance: ±25%; Rated Current: 1.3A; DC Resistance: 140mΩ; RoHS: Yes; ComponentLink1Description: Datasheet; ComponentLink1URL: https://wmsc.lcsc.com/wmsc/upload/file/pdf/v2/lcsc/2310301640_Sunlord-MZAS1608G121-1R3TF_C709642.pdf; ComponentLink2Description: JLCPCB Part URL; ComponentLink2URL: https://jlcpcb.com/partdetail/C709642; ComponentLink3Description: LCSC Part URL; ComponentLink3URL: https://lcsc.com/product-detail/Ferrite-Beads_Sunlord-Sunlord-MZAS1608G121-1R3TF_C709642.html
footprint FB-0603 (0603 (1608M) Ferrite)
pins: 1, 2

## MZAS1608G251-1R1TF
designator FB?  Impedance @ Frequency: 250Ω@100MHz
Ferrite, 250Ω@100MHz, ±25%, 190mΩ, 1.1A, SMD 0603; Manufacturer: Sunlord; Manufacturer Part Number: MZAS1608G251-1R1TF; Package Size: 0603; JLCPCB Basic Part: No; JLCPCB Part Number: C709643; Supplier 1: LCSC; Category: Ferrite Beads; Supplier Part Number 1: C709643; Tolerance: ±25%; Rated Current: 1.1A; DC Resistance: 190mΩ; RoHS: Yes; ComponentLink1Description: Datasheet; ComponentLink1URL: https://wmsc.lcsc.com/wmsc/upload/file/pdf/v2/lcsc/2310301640_Sunlord-MZAS1608G251-1R1TF_C709643.pdf; ComponentLink2Description: JLCPCB Part URL; ComponentLink2URL: https://jlcpcb.com/partdetail/C709643; ComponentLink3Description: LCSC Part URL; ComponentLink3URL: https://lcsc.com/product-detail/Ferrite-Beads_Sunlord-Sunlord-MZAS1608G251-1R1TF_C709643.html
footprint FB-0603 (0603 (1608M) Ferrite)
pins: 1, 2

## MZAS1608K501-R95TF
designator FB?  Impedance @ Frequency: 500Ω@100MHz
Ferrite, 500Ω@100MHz, ±25%, 250mΩ, 950mA, SMD 0603; Manufacturer: Sunlord; Manufacturer Part Number: MZAS1608K501-R95TF; Package Size: 0603; JLCPCB Basic Part: No; JLCPCB Part Number: C709644; Supplier 1: LCSC; Category: Ferrite Beads; Supplier Part Number 1: C709644; Tolerance: ±25%; Rated Current: 950mA; DC Resistance: 250mΩ; RoHS: Yes; ComponentLink1Description: Datasheet; ComponentLink1URL: https://wmsc.lcsc.com/wmsc/upload/file/pdf/v2/lcsc/2310301640_Sunlord-MZAS1608K501-R95TF_C709644.pdf; ComponentLink2Description: JLCPCB Part URL; ComponentLink2URL: https://jlcpcb.com/partdetail/C709644; ComponentLink3Description: LCSC Part URL; ComponentLink3URL: https://lcsc.com/product-detail/Ferrite-Beads_Sunlord-Sunlord-MZAS1608K501-R95TF_C709644.html
footprint FB-0603 (0603 (1608M) Ferrite)
pins: 1, 2

## NBQ160808T-220Y-N
designator FB?  Impedance @ Frequency: 22Ω@100MHz
Ferrite, 22Ω@100MHz, SMD 0603; Manufacturer: Chilisin Elec; Manufacturer Part Number: NBQ160808T-220Y-N; Package Size: 0603; JLCPCB Basic Part: No; JLCPCB Part Number: C285678; Supplier 1: LCSC; Category: Ferrite Beads; Supplier Part Number 1: C285678; RoHS: Yes; ComponentLink1Description: Datasheet; ComponentLink2Description: JLCPCB Part URL; ComponentLink2URL: https://jlcpcb.com/partdetail/C285678; ComponentLink3Description: LCSC Part URL; ComponentLink3URL: https://lcsc.com/product-detail/Ferrite-Beads_Chilisin-Elec-Chilisin-Elec-NBQ160808T-220Y-N_C285678.html
pins: 1, 2

## NBQ160808T-252Y-N
designator FB?  Impedance @ Frequency: 2500Ω@100MHz
Ferrite, 2500Ω@100MHz, ±25%, 1Ω, 100mA, SMD 0603; Manufacturer: Chilisin Elec; Manufacturer Part Number: NBQ160808T-252Y-N; Package Size: 0603; JLCPCB Basic Part: No; JLCPCB Part Number: C280598; Supplier 1: LCSC; Category: Ferrite Beads; Supplier Part Number 1: C280598; Tolerance: ±25%; Rated Current: 100mA; DC Resistance: 1Ω; RoHS: Yes; ComponentLink1Description: Datasheet; ComponentLink1URL: https://wmsc.lcsc.com/wmsc/upload/file/pdf/v2/lcsc/2304140030_Chilisin-Elec-NBQ160808T-252Y-N_C280598.pdf; ComponentLink2Description: JLCPCB Part URL; ComponentLink2URL: https://jlcpcb.com/partdetail/C280598; ComponentLink3Description: LCSC Part URL; ComponentLink3URL: https://lcsc.com/product-detail/Ferrite-Beads_Chilisin-Elec-Chilisin-Elec-NBQ160808T-252Y-N_C280598.html
footprint FB-0603 (0603 (1608M) Ferrite)
pins: 1, 2

## NBQ160808T-600Y-N
designator FB?  Impedance @ Frequency: 60Ω@100MHz
Ferrite, 60Ω@100MHz, ±25%, 0.25Ω, 500mA, SMD 0603; Manufacturer: Chilisin Elec; Manufacturer Part Number: NBQ160808T-600Y-N; Package Size: 0603; JLCPCB Basic Part: No; JLCPCB Part Number: C285676; Supplier 1: LCSC; Category: Ferrite Beads; Supplier Part Number 1: C285676; Tolerance: ±25%; Rated Current: 500mA; DC Resistance: 0.25Ω; RoHS: Yes; ComponentLink1Description: Datasheet; ComponentLink1URL: https://wmsc.lcsc.com/wmsc/upload/file/pdf/v2/lcsc/2304140030_Chilisin-Elec-NBQ160808T-600Y-N_C285676.pdf; ComponentLink2Description: JLCPCB Part URL; ComponentLink2URL: https://jlcpcb.com/partdetail/C285676; ComponentLink3Description: LCSC Part URL; ComponentLink3URL: https://lcsc.com/product-detail/Ferrite-Beads_Chilisin-Elec-Chilisin-Elec-NBQ160808T-600Y-N_C285676.html
footprint FB-0603 (0603 (1608M) Ferrite)
pins: 1, 2

## NBQ160808T-601Y-N
designator FB?  Impedance @ Frequency: 600Ω@100MHz
Ferrite, 600Ω@100MHz, ±25%, 0.5Ω, 200mA, SMD 0603; Manufacturer: Chilisin Elec; Manufacturer Part Number: NBQ160808T-601Y-N; Package Size: 0603; JLCPCB Basic Part: No; JLCPCB Part Number: C285675; Supplier 1: LCSC; Category: Ferrite Beads; Supplier Part Number 1: C285675; Tolerance: ±25%; Rated Current: 200mA; DC Resistance: 0.5Ω; RoHS: Yes; ComponentLink1Description: Datasheet; ComponentLink1URL: https://wmsc.lcsc.com/wmsc/upload/file/pdf/v2/lcsc/2304140030_Chilisin-Elec-NBQ160808T-601Y-N_C285675.pdf; ComponentLink2Description: JLCPCB Part URL; ComponentLink2URL: https://jlcpcb.com/partdetail/C285675; ComponentLink3Description: LCSC Part URL; ComponentLink3URL: https://lcsc.com/product-detail/Ferrite-Beads_Chilisin-Elec-Chilisin-Elec-NBQ160808T-601Y-N_C285675.html
footprint FB-0603 (0603 (1608M) Ferrite)
pins: 1, 2

## PB1608-121_3A0
designator FB?  Impedance @ Frequency: 120Ω@100MHz
Ferrite, 120Ω@100MHz, ±25%, 0.055Ω, 3A, SMD 0603; Manufacturer: CEC(Shenzhen Zhenhua Fu Elec); Manufacturer Part Number: PB1608-121/3A0; Package Size: 0603; JLCPCB Basic Part: No; JLCPCB Part Number: C2982980; Supplier 1: LCSC; Category: Ferrite Beads; Supplier Part Number 1: C2982980; Tolerance: ±25%; Rated Current: 3A; DC Resistance: 0.055Ω; RoHS: Yes; ComponentLink1Description: Datasheet; ComponentLink1URL: https://wmsc.lcsc.com/wmsc/upload/file/pdf/v2/lcsc/2203221830_CEC-Shenzhen-Zhenhua-Fu-Elec-PB1608-121-3A0_C2982980.pdf; ComponentLink2Description: JLCPCB Part URL; ComponentLink2URL: https://jlcpcb.com/partdetail/C2982980; ComponentLink3Description: LCSC Part URL; ComponentLink3URL: https://lcsc.com/product-detail/Ferrite-Beads_CECShenzhen-Zhenhua-Fu-Elec-CECShenzhen-Zhenhua-Fu-Elec-PB1608-121-3A0_C2982980.html
footprint FB-0603 (0603 (1608M) Ferrite)
pins: 1, 2
